# Altium schematic symbol library 13-Logicold 逻辑 IC.SchLib: 297 symbols (part 8 of 30)
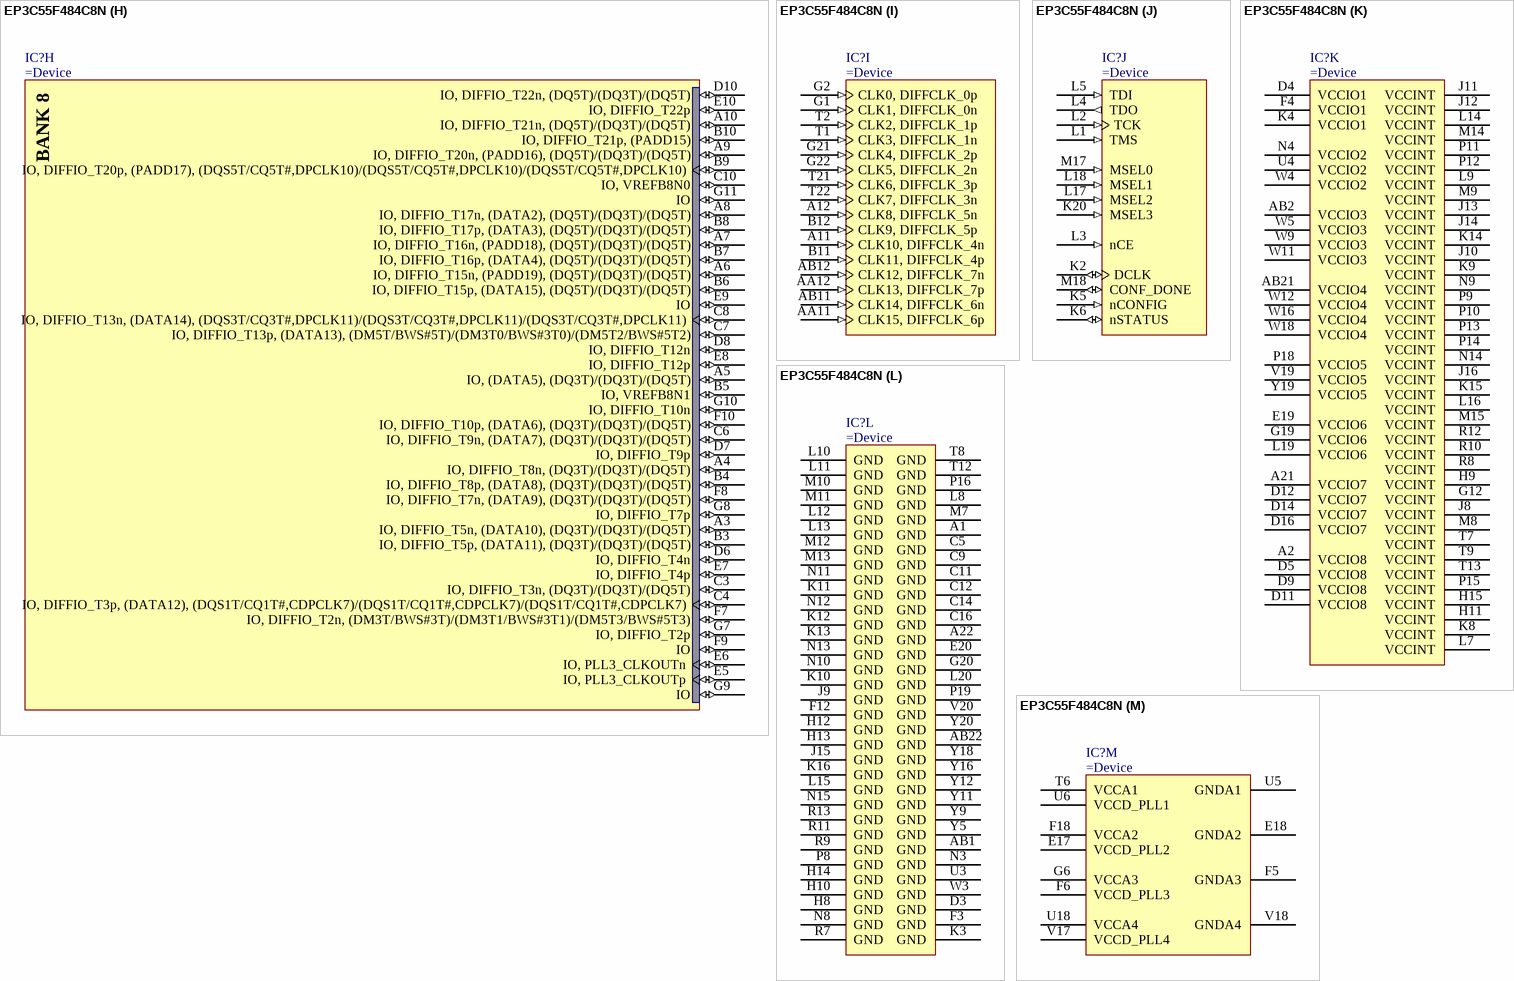
[diagram p169: symbol EP3C55F484C8N]

## EP3C55F484C8N
designator IC?
Cyclone III Family FPGA, 377 I/O Pins, 4 PLLs, 484-Pin FBGA, Speed Grade 8, Commercial Grade
part A pins: B1 IO, DIFFIO_L2n, (DQ2L)/(DQ1L)/(DQ1L) (io), B2 IO, DIFFIO_L2p, (DQ2L)/(DQ1L)/(DQ1L) (io), C1 IO, DIFFIO_L4n, (DQ2L)/(DQ1L)/(DQ1L) (io), C2 IO, DIFFIO_L4p, (DQS2L/CQ3L,CDPCLK0)/(DQS2L/CQ3L,CDPCLK0)/(DQS2L/CQ3L,CDPCLK0) (io), D1 IO, DIFFIO_L5n, (DATA1, ASDO) (io), D2 IO, DIFFIO_L5p, (DQ2L)/(DQ1L)/(DQ1L) (io), E1 IO, DIFFIO_L8n, _/(DQ1L)/(DQ1L) (io), E2 IO, DIFFIO_L8p, (FLASH_nCE, nCSO) (io), E3 IO, DIFFIO_L3n, (DQ2L)/(DQ1L)/(DQ1L) (io), E4 IO, DIFFIO_L3p, (nRESET), (DQ2L)/(DQ1L)/(DQ1L) (io), F1 IO, DIFFIO_L9n, (DQ0L)/(DQ1L)/(DQ1L) (io), F2 IO, DIFFIO_L9p, (DM2L)/(DM1L0/BWS#1L0)/(DM1L0/BWS#1L0) (io), G3 IO, DIFFIO_L1n (io), G4 IO, DIFFIO_L1p (io), G5 IO, VREFB1N0 (io), H1 IO, DIFFIO_L13n, (DQ0L)/(DQ1L)/(DQ1L) (io), H2 IO, DIFFIO_L13p, (DQ0L)/(DQ1L)/(DQ1L) (io), H3 IO, DIFFIO_L7n (io), H4 IO, DIFFIO_L7p (io), H5 IO, VREFB1N1 (io), H6 IO, DIFFIO_L6p, (DQ2L)/(DQ1L)/(DQ1L) (io), H7 IO (io), J1 IO, DIFFIO_L15n, (DQ0L)/(DQ1L)/(DQ1L) (io), J2 IO, DIFFIO_L15p, (DQ0L)/(DQ1L)/(DQ1L) (io), J3 IO (io), J4 IO, (DQS0L/CQ1L,DPCLK0)/(DQS0L/CQ1L,DPCLK0)/(DQS0L/CQ1L,DPCLK0) (io), J5 IO (io), J6 IO, DIFFIO_L6n, (DQ2L)/(DQ1L)/(DQ1L) (io), J7 IO, DIFFIO_L11p (io), K1 IO, (DATA0) (io), K7 IO, DIFFIO_L11n (io)
part B pins: AA1 IO, DIFFIO_L31n, (DQ3L)/(DQ3L)/(DQ1L) (io), AA2 IO, DIFFIO_L31p (io), L6 IO, DIFFIO_L16p, (DQ0L)/(DQ1L)/(DQ1L) (io), M1 IO, DIFFIO_L17n, _/(DQ1L)/(DQ1L) (io), M2 IO, DIFFIO_L17p, (DQ0L)/(DQ1L)/(DQ1L) (io), M3 IO, DIFFIO_L18n, (DQ1L)/(DQ3L)/(DQ1L) (io), M4 IO, DIFFIO_L18p, (DM0L)/(DM1L1/BWS#1L1)/(DM1L1/BWS#1L1) (io), M5 IO, VREFB2N0 (io), M6 IO, DIFFIO_L16n, (DQ0L)/(DQ1L)/(DQ1L) (io), N1 IO, DIFFIO_L19n, (DQ1L)/(DQ3L)/(DQ1L) (io), N2 IO, DIFFIO_L19p, (DQ1L)/(DQ3L)/(DQ1L) (io), N5 IO, (DQ1L)/(DQ3L)/(DQ1L) (io), N6 IO, DIFFIO_L26n, (DQ3L)/(DQ3L)/(DQ1L) (io), N7 IO, DIFFIO_L30p (io), P1 IO, DIFFIO_L20n, (DQ1L)/(DQ3L)/(DQ1L) (io), P2 IO, DIFFIO_L20p, (DQ1L)/(DQ3L)/(DQ1L) (io), P3 IO, DIFFIO_L23n, (DQ1L)/(DQ3L)/(DQ1L) (io), P4 IO, DIFFIO_L23p, (DQS1L/CQ1L#,DPCLK1)/(DQS1L/CQ1L#,DPCLK1)/(DQS1L/CQ1L#,DPCLK1) (io), P5 IO, DIFFIO_L26p (io), P6 IO, DIFFIO_L32p (io), P7 IO, DIFFIO_L30n (io), R1 IO, DIFFIO_L21n, (DQ1L)/(DQ3L)/(DQ1L) (io), R2 IO, DIFFIO_L21p, (DQ1L)/(DQ3L)/(DQ1L) (io), R3 IO, DIFFIO_L27n (io), R4 IO, DIFFIO_L27p (io), R5 IO, DIFFIO_L32n (io), R6 IO, DIFFIO_L33n (io), T3 IO, VREFB2N1 (io), T4 IO, (DQS3L/CQ3L#,CDPCLK1)/(DQS3L/CQ3L#,CDPCLK1)/(DQS3L/CQ3L#,CDPCLK1) (io), T5 IO, DIFFIO_L33p, (DM3L/BWS#3L)/(DM3L1/BWS#3L1)/(DM1L3/BWS#1L3) (io), U1 IO, DIFFIO_L24n, (DQ3L)/(DQ3L)/(DQ1L) (io), U2 IO, DIFFIO_L24p, (DM1L/BWS#1L)/(DM3L0/BWS#3L0)/(DM1L2/BWS#1L2) (io), V1 IO, DIFFIO_L25n, (DQ3L)/(DQ3L)/(DQ1L) (io), V2 IO, DIFFIO_L25p, (DQ3L)/(DQ3L)/(DQ1L) (io), V3 IO, RDN1 (io), V4 IO, RUP1 (io), W1 IO, DIFFIO_L28n, (DQ3L)/(DQ3L)/(DQ1L) (io), W2 IO, DIFFIO_L28p, (DQ3L)/(DQ3L)/(DQ1L) (io), Y1 IO, DIFFIO_L29n, (DQ3L)/(DQ3L)/(DQ1L) (io), Y2 IO, DIFFIO_L29p, (DQ3L)/(DQ3L)/(DQ1L) (io)
part C pins: AA3 IO, PLL1_CLKOUTp (io), AA4 IO, (DQ3B)/(DQ3B)/(DQ5B) (io), AA5 IO, DIFFIO_B5p, (DQ3B)/(DQ3B)/(DQ5B) (io), AA6 IO, DIFFIO_B5n (io), AA7 IO, DIFFIO_B10p, (DM5B/BWS#5B)/(DM3B0/BWS#3B0)/(DM5B2/BWS#5B2) (io), AA8 IO, DIFFIO_B17p, (DQ5B)/(DQ3B)/(DQ5B) (io), AA9 IO, DIFFIO_B18p, (DQ5B)/(DQ3B)/(DQ5B) (io), AA10 IO, DIFFIO_B21p, (DM4B)/(DM5B1/BWS#5B1)/(DM5B1/BWS#5B1) (io), AB3 IO, PLL1_CLKOUTn (io), AB4 IO, VREFB3N1 (io), AB5 IO, DIFFIO_B6n (io), AB6 IO, DIFFIO_B6p (io), AB7 IO, DIFFIO_B10n, (DQ5B)/(DQ3B)/(DQ5B) (io), AB8 IO, DIFFIO_B17n, (DQ5B)/(DQ3B)/(DQ5B) (io), AB9 IO, DIFFIO_B18n, (DQS5B/CQ5B#,DPCLK3)/(DQS5B/CQ5B#,DPCLK3)/(DQS5B/CQ5B#,DPCLK3) (io), AB10 IO, DIFFIO_B21n, _/(DQ5B)/(DQ5B) (io), T10 IO, DIFFIO_B13p (io), T11 IO, DIFFIO_B13n (io), U7 IO, DIFFIO_B2p (io), U8 IO, DIFFIO_B2n (io), U9 IO, DIFFIO_B8p, (DQ3B)/(DQ3B)/(DQ5B) (io), U10 IO, (DQ5B)/(DQ3B)/(DQ5B) (io), U11 IO, DIFFIO_B19p (io), V5 IO, DIFFIO_B1n, (DM3B/BWS#3B)/(DM3B1/BWS#3B1)/(DM5B3/BWS#5B3) (io), V6 IO, DIFFIO_B1p (io), V7 IO, DIFFIO_B4n (io), V8 IO, DIFFIO_B8n, (DQ3B)/(DQ3B)/(DQ5B) (io), V9 IO, VREFB3N0 (io), V10 IO, (DQS3B/CQ3B#,DPCLK2)/(DQS3B/CQ3B#,DPCLK2)/(DQS3B/CQ3B#,DPCLK2) (io), V11 IO, DIFFIO_B19n, (DQ5B)/(DQ3B)/(DQ5B) (io), W6 IO, DIFFIO_B4p, (DQ3B)/(DQ3B)/(DQ5B) (io), W7 IO, DIFFIO_B7p, (DQ3B)/(DQ3B)/(DQ5B) (io), W8 IO, (DQ3B)/(DQ3B)/(DQ5B) (io), W10 IO, DIFFIO_B20p, (DQ5B)/(DQ3B)/(DQ5B) (io), Y3 IO, DIFFIO_B3n, (DQ3B)/(DQ3B)/(DQ5B) (io), Y4 IO, DIFFIO_B3p (io), Y6 IO, (DQS1B/CQ1B#,CDPCLK2)/(DQS1B/CQ1B#,CDPCLK2)/(DQS1B/CQ1B#,CDPCLK2) (io), Y7 IO, DIFFIO_B7n, (DQ3B)/(DQ3B)/(DQ5B) (io), Y8 IO, (DQ5B)/(DQ3B)/(DQ5B) (io), Y10 IO, DIFFIO_B20n, (DQ5B)/(DQ3B)/(DQ5B) (io)
part D pins: AA13 IO, DIFFIO_B23p, (DQ4B)/(DQ5B)/(DQ5B) (io), AA14 IO, DIFFIO_B25p, (DQ4B)/(DQ5B)/(DQ5B) (io), AA15 IO, DIFFIO_B27p, (DQ4B)/(DQ5B)/(DQ5B) (io), AA16 IO, DIFFIO_B30p, (DM2B)/(DM5B0/BWS#5B0)/(DM5B0/BWS#5B0) (io), AA17 IO, DIFFIO_B37p (io), AA18 IO, VREFB4N0 (io), AA19 IO, RUP2 (io), AA20 IO, DIFFIO_B39p, _/(DQ5B)/(DQ5B) (io), AB13 IO, DIFFIO_B23n, (DQ4B)/(DQ5B)/(DQ5B) (io), AB14 IO, DIFFIO_B25n, (DQ4B)/(DQ5B)/(DQ5B) (io), AB15 IO, DIFFIO_B27n, (DQ4B)/(DQ5B)/(DQ5B) (io), AB16 IO, DIFFIO_B30n, (DQ2B)/(DQ5B)/(DQ5B) (io), AB17 IO, DIFFIO_B37n (io), AB18 IO, (DQ2B)/(DQ5B)/(DQ5B) (io), AB19 IO, RDN2 (io), AB20 IO, DIFFIO_B39n, (DQ2B)/(DQ5B)/(DQ5B) (io), R14 IO, DIFFIO_B41p (io), R15 IO, DIFFIO_B41n (io), R16 IO, PLL4_CLKOUTn (io), T14 IO, DIFFIO_B36p (io), T15 IO, DIFFIO_B36n, (DQ2B)/(DQ5B)/(DQ5B) (io), T16 IO, PLL4_CLKOUTp (io), U12 IO, (DQ4B)/(DQ5B)/(DQ5B) (io), U13 IO (io), U14 IO, DIFFIO_B33n (io), U15 IO, DIFFIO_B34p (io), U16 IO, DIFFIO_B40p (io), U17 IO, DIFFIO_B40n (io), V12 IO, VREFB4N1 (io), V13 IO, DIFFIO_B31p, (DQS2B/CQ3B,DPCLK5)/(DQS2B/CQ3B,DPCLK5)/(DQS2B/CQ3B,DPCLK5) (io), V14 IO, DIFFIO_B33p, (DQ2B)/(DQ5B)/(DQ5B) (io), V15 IO, DIFFIO_B34n, (DQ2B)/(DQ5B)/(DQ5B) (io), V16 IO (io), W13 IO, DIFFIO_B26p, (DQ4B)/(DQ5B)/(DQ5B) (io), W14 IO, DIFFIO_B31n (io), W15 IO, (DQ2B)/(DQ5B)/(DQ5B) (io), W17 IO, DIFFIO_B38p, (DQ2B)/(DQ5B)/(DQ5B) (io), Y13 IO, DIFFIO_B26n, (DQS4B/CQ5B,DPCLK4)/(DQS4B/CQ5B,DPCLK4)/(DQS4B/CQ5B,DPCLK4) (io), Y14 IO, DIFFIO_B29p (io), Y15 IO, DIFFIO_B29n (io), Y17 IO, DIFFIO_B38n, (DQS0B/CQ1B,CDPCLK3)/(DQS0B/CQ1B,CDPCLK3)/(DQS0B/CQ1B,CDPCLK3) (io)
part E pins: AA21 IO, DIFFIO_R36p, (DM3R/BWS#3R)/(DM3R1/BWS#3R1)/(DM1R3/BWS#1R3) (io), AA22 IO, DIFFIO_R36n (io), M16 IO (io), M19 IO, DIFFIO_R18p, (DQ1R)/(DQ3R)/(DQ1R) (io), M20 IO, DIFFIO_R18n, (DQ1R)/(DQ3R)/(DQ1R) (io), M21 IO, DIFFIO_R19p, (DQ1R)/(DQ3R)/(DQ1R) (io), M22 IO, DIFFIO_R19n, (DQ1R)/(DQ3R)/(DQ1R) (io), N16 IO (io), N17 IO, DIFFIO_R21n (io), N18 IO, DIFFIO_R21p, (DQS1R/CQ1R#,DPCLK6)/(DQS1R/CQ1R#,DPCLK6)/(DQS1R/CQ1R#,DPCLK6) (io), N19 IO, DIFFIO_R22p (io), N20 IO, DIFFIO_R22n, (DQ1R)/(DQ3R)/(DQ1R) (io), N21 IO, DIFFIO_R20p, (DEV_CLRn) (io), N22 IO, DIFFIO_R20n, (DEV_OE) (io), P17 IO, DIFFIO_R30p (io), P20 IO, VREFB5N0 (io), P21 IO, DIFFIO_R23p, (DQ1R)/(DQ3R)/(DQ1R) (io), P22 IO, DIFFIO_R23n, (DQ1R)/(DQ3R)/(DQ1R) (io), R17 IO, DIFFIO_R30n (io), R18 IO, DIFFIO_R26n (io), R19 IO, DIFFIO_R26p, (DM1R/BWS#1R)/(DM3R0/BWS#3R0)/(DM1R2/BWS#1R2) (io), R20 IO, (DQ3R)/(DQ3R)/(DQ1R) (io), R21 IO, DIFFIO_R24p, (DQ1R)/(DQ3R)/(DQ1R) (io), R22 IO, DIFFIO_R24n, (DQ1R)/(DQ3R)/(DQ1R) (io), T17 IO, RUP3 (io), T18 IO, RDN3 (io), T19 IO, DIFFIO_R31p (io), T20 IO, DIFFIO_R31n (io), U19 IO, DIFFIO_R34p (io), U20 IO, DIFFIO_R34n, (DQ3R)/(DQ3R)/(DQ1R) (io), U21 IO, DIFFIO_R27p, (DQ3R)/(DQ3R)/(DQ1R) (io), U22 IO, DIFFIO_R27n, (DQ3R)/(DQ3R)/(DQ1R) (io), V21 IO, DIFFIO_R29p, (DQ3R)/(DQ3R)/(DQ1R) (io), V22 IO, DIFFIO_R29n, (DQ3R)/(DQ3R)/(DQ1R) (io), W19 IO, VREFB5N1 (io), W20 IO, (DQS3R/CQ3R#,CDPCLK4)/(DQS3R/CQ3R#,CDPCLK4)/(DQS3R/CQ3R#,CDPCLK4) (io), W21 IO, DIFFIO_R32p, (DQ3R)/(DQ3R)/(DQ1R) (io), W22 IO, DIFFIO_R32n, (DQ3R)/(DQ3R)/(DQ1R) (io), Y21 IO, DIFFIO_R35p (io), Y22 IO, DIFFIO_R35n, (DQ3R)/(DQ3R)/(DQ1R) (io)
part F pins: B21 IO, DIFFIO_R3p, (PADD21), (DQ2R)/(DQ1R)/(DQ1R) (io), B22 IO, DIFFIO_R3n, (PADD22), (DQ2R)/(DQ1R)/(DQ1R) (io), C20 IO, DIFFIO_R2n, (PADD20), (DQS2R/CQ3R,CDPCLK5)/(DQS2R/CQ3R,CDPCLK5)/(DQS2R/CQ3R,CDPCLK5) (io), C21 IO, DIFFIO_R4p, (DQ2R)/(DQ1R)/(DQ1R) (io), C22 IO, DIFFIO_R4n, (DQ2R)/(DQ1R)/(DQ1R) (io), D20 IO, DIFFIO_R2p (io), D21 IO, DIFFIO_R7p, _/(DQ1R)/(DQ1R) (io), D22 IO, DIFFIO_R7n, (DM2R)/(DM1R0/BWS#1R0)/(DM1R0/BWS#1R0) (io), E21 IO, DIFFIO_R8p, (nOE), _/(DQ1R)/(DQ1R) (io), E22 IO, DIFFIO_R8n, (nWE), (DQ0R)/(DQ1R)/(DQ1R) (io), F17 IO, DIFFIO_R1n, (DQ2R)/(DQ1R)/(DQ1R) (io), F19 IO, DIFFIO_R6p, (RDY), (DQ2R)/(DQ1R)/(DQ1R) (io), F20 IO, DIFFIO_R6n, (nAVD), (DQ2R)/(DQ1R)/(DQ1R) (io), F21 IO, DIFFIO_R11p, (DQ0R)/(DQ1R)/(DQ1R) (io), F22 IO, DIFFIO_R11n, (DQ0R)/(DQ1R)/(DQ1R) (io), G17 IO, DIFFIO_R1p (io), G18 IO, DIFFIO_R5n, (PADD23), (DQ2R)/(DQ1R)/(DQ1R) (io), H16 IO (io), H17 IO, DIFFIO_R5p (io), H18 IO, VREFB6N0 (io), H19 IO, DIFFIO_R9p, (DQ0R)/(DQ1R)/(DQ1R) (io), H20 IO, DIFFIO_R9n, (DQ0R)/(DQ1R)/(DQ1R) (io), H21 IO, DIFFIO_R14p, (DQ0R)/(DQ1R)/(DQ1R) (io), H22 IO, DIFFIO_R14n, (DQ0R)/(DQ1R)/(DQ1R) (io), J17 IO (io), J18 IO (io), J19 IO, DIFFIO_R10p (io), J20 IO, DIFFIO_R10n (io), J21 IO, DIFFIO_R15p, (DM0R)/(DM1R1/BWS#1R1)/(DM1R1/BWS#1R1) (io), J22 IO, DIFFIO_R15n, (DQS0R/CQ1R,DPCLK7)/(DQS0R/CQ1R,DPCLK7)/(DQS0R/CQ1R,DPCLK7) (io), K17 IO, DIFFIO_R13n (io), K18 IO, DIFFIO_R13p, (DQ0R)/(DQ1R)/(DQ1R) (io), K19 IO, VREFB6N1 (io), K21 IO, DIFFIO_R16p, (CLKUSR) (io), K22 IO, DIFFIO_R16n, (nCEO) (io), L21 IO, DIFFIO_R17p, (CRC_ERROR) (io), L22 IO, DIFFIO_R17n, (INIT_DONE) (io)
part G pins: A13 IO, DIFFIO_T24n, (PADD11), (DQ4T)/(DQ5T)/(DQ5T) (io), A14 IO, DIFFIO_T25n, (PADD9), (DQ4T)/(DQ5T)/(DQ5T) (io), A15 IO, DIFFIO_T27n, (PADD5), (DQ4T)/(DQ5T)/(DQ5T) (io), A16 IO, DIFFIO_T30n, (DM2T)/(DM5T0/BWS#5T0)/(DM5T0/BWS#5T0) (io), A17 IO, DIFFIO_T31n, (PADD1), (DQ2T)/(DQ5T)/(DQ5T) (io), A18 IO, DIFFIO_T34n, (DQ2T)/(DQ5T)/(DQ5T) (io), A19 IO, RDN4 (io), A20 IO, PLL2_CLKOUTn (io), B13 IO, DIFFIO_T24p, (PADD12), (DQS4T/CQ5T,DPCLK9)/(DQS4T/CQ5T,DPCLK9)/(DQS4T/CQ5T,DPCLK9) (io), B14 IO, DIFFIO_T25p, (PADD10), (DQ4T)/(DQ5T)/(DQ5T) (io), B15 IO, DIFFIO_T27p, (PADD6), (DQ4T)/(DQ5T)/(DQ5T) (io), B16 IO, DIFFIO_T30p, (DQ4T)/(DQ5T)/(DQ5T) (io), B17 IO, DIFFIO_T31p, (PADD2), _/(DQ5T)/(DQ5T) (io), B18 IO, DIFFIO_T34p, (PADD0) (io), B19 IO, RUP4 (io), B20 IO, PLL2_CLKOUTp (io), C13 IO, DIFFIO_T26n, (PADD7) (io), C15 IO, VREFB7N1 (io), C17 IO, (DQ2T)/(DQ5T)/(DQ5T) (io), C18 IO, DIFFIO_T39n (io), C19 IO, DIFFIO_T37n, (DQ2T)/(DQ5T)/(DQ5T) (io), D13 IO, DIFFIO_T26p, (PADD8), (DQ4T)/(DQ5T)/(DQ5T) (io), D15 IO, DIFFIO_T33n (io), D17 IO, VREFB7N0 (io), D18 IO, DIFFIO_T39p (io), D19 IO, DIFFIO_T37p, (DQ2T)/(DQ5T)/(DQ5T) (io), E11 IO, DIFFIO_T23n, (PADD13) (io), E12 IO, _/(DQ5T)/(DQ5T) (io), E13 IO (io), E14 IO, DIFFIO_T28n, (PADD3), (DQ4T)/(DQ5T)/(DQ5T) (io), E15 IO, DIFFIO_T33p, (DQ2T)/(DQ5T)/(DQ5T) (io), E16 IO, DIFFIO_T42p, (DQ2T)/(DQ5T)/(DQ5T) (io), F11 IO, DIFFIO_T23p, (PADD14), (DM4T)/(DM5T1/BWS#5T1)/(DM5T1/BWS#5T1) (io), F13 IO, DIFFIO_T28p, (PADD4), (DQS2T/CQ3T,DPCLK8)/(DQS2T/CQ3T,DPCLK8)/(DQS2T/CQ3T,DPCLK8) (io), F14 IO, DIFFIO_T40p, (DQS0T/CQ1T,CDPCLK6)/(DQS0T/CQ1T,CDPCLK6)/(DQS0T/CQ1T,CDPCLK6) (io), F15 IO, DIFFIO_T41n, (DQ2T)/(DQ5T)/(DQ5T) (io), F16 IO, DIFFIO_T42n (io), G13 IO, DIFFIO_T32p (io), G14 IO, DIFFIO_T32n (io), G15 IO, DIFFIO_T40n (io), G16 IO, DIFFIO_T41p (io)
part H pins: A3 IO, DIFFIO_T5n, (DATA10), (DQ3T)/(DQ3T)/(DQ5T) (io), A4 IO, DIFFIO_T8n, (DQ3T)/(DQ3T)/(DQ5T) (io), A5 IO, (DATA5), (DQ3T)/(DQ3T)/(DQ5T) (io), A6 IO, DIFFIO_T15n, (PADD19), (DQ5T)/(DQ3T)/(DQ5T) (io), A7 IO, DIFFIO_T16n, (PADD18), (DQ5T)/(DQ3T)/(DQ5T) (io), A8 IO, DIFFIO_T17n, (DATA2), (DQ5T)/(DQ3T)/(DQ5T) (io), A9 IO, DIFFIO_T20n, (PADD16), (DQ5T)/(DQ3T)/(DQ5T) (io), A10 IO, DIFFIO_T21n, (DQ5T)/(DQ3T)/(DQ5T) (io), B3 IO, DIFFIO_T5p, (DATA11), (DQ3T)/(DQ3T)/(DQ5T) (io), B4 IO, DIFFIO_T8p, (DATA8), (DQ3T)/(DQ3T)/(DQ5T) (io), B5 IO, VREFB8N1 (io), B6 IO, DIFFIO_T15p, (DATA15), (DQ5T)/(DQ3T)/(DQ5T) (io), B7 IO, DIFFIO_T16p, (DATA4), (DQ5T)/(DQ3T)/(DQ5T) (io), B8 IO, DIFFIO_T17p, (DATA3), (DQ5T)/(DQ3T)/(DQ5T) (io), B9 IO, DIFFIO_T20p, (PADD17), (DQS5T/CQ5T#,DPCLK10)/(DQS5T/CQ5T#,DPCLK10)/(DQS5T/CQ5T#,DPCLK10) (io), B10 IO, DIFFIO_T21p, (PADD15) (io), C3 IO, DIFFIO_T3n, (DQ3T)/(DQ3T)/(DQ5T) (io), C4 IO, DIFFIO_T3p, (DATA12), (DQS1T/CQ1T#,CDPCLK7)/(DQS1T/CQ1T#,CDPCLK7)/(DQS1T/CQ1T#,CDPCLK7) (io), C6 IO, DIFFIO_T9n, (DATA7), (DQ3T)/(DQ3T)/(DQ5T) (io), C7 IO, DIFFIO_T13p, (DATA13), (DM5T/BWS#5T)/(DM3T0/BWS#3T0)/(DM5T2/BWS#5T2) (io), C8 IO, DIFFIO_T13n, (DATA14), (DQS3T/CQ3T#,DPCLK11)/(DQS3T/CQ3T#,DPCLK11)/(DQS3T/CQ3T#,DPCLK11) (io), C10 IO, VREFB8N0 (io), D6 IO, DIFFIO_T4n (io), D7 IO, DIFFIO_T9p (io), D8 IO, DIFFIO_T12n (io), D10 IO, DIFFIO_T22n, (DQ5T)/(DQ3T)/(DQ5T) (io), E5 IO, PLL3_CLKOUTp (io), E6 IO, PLL3_CLKOUTn (io), E7 IO, DIFFIO_T4p (io), E8 IO, DIFFIO_T12p (io), E9 IO (io), E10 IO, DIFFIO_T22p (io), F7 IO, DIFFIO_T2n, (DM3T/BWS#3T)/(DM3T1/BWS#3T1)/(DM5T3/BWS#5T3) (io), F8 IO, DIFFIO_T7n, (DATA9), (DQ3T)/(DQ3T)/(DQ5T) (io), F9 IO (io), F10 IO, DIFFIO_T10p, (DATA6), (DQ3T)/(DQ3T)/(DQ5T) (io), G7 IO, DIFFIO_T2p (io), G8 IO, DIFFIO_T7p (io), G9 IO (io), G10 IO, DIFFIO_T10n (io), G11 IO (io)
part I pins: A11 CLK10, DIFFCLK_4n (in), A12 CLK8, DIFFCLK_5n (in), AA11 CLK15, DIFFCLK_6p (in), AA12 CLK13, DIFFCLK_7p (in), AB11 CLK14, DIFFCLK_6n (in), AB12 CLK12, DIFFCLK_7n (in), B11 CLK11, DIFFCLK_4p (in), B12 CLK9, DIFFCLK_5p (in), G1 CLK1, DIFFCLK_0n (in), G2 CLK0, DIFFCLK_0p (in), G21 CLK4, DIFFCLK_2p (in), G22 CLK5, DIFFCLK_2n (in), T1 CLK3, DIFFCLK_1n (in), T2 CLK2, DIFFCLK_1p (in), T21 CLK6, DIFFCLK_3p (in), T22 CLK7, DIFFCLK_3n (in)
part J pins: K2 DCLK (io), K5 nCONFIG (in), K6 nSTATUS (io), K20 MSEL3 (in), L1 TMS (in), L2 TCK (in), L3 nCE (in), L4 TDO (out), L5 TDI (in), L17 MSEL2 (in), L18 MSEL1 (in), M17 MSEL0 (in), M18 CONF_DONE (io)
part K pins: A2 VCCIO8 (power), A21 VCCIO7 (power), AB2 VCCIO3 (power), AB21 VCCIO4 (power), D4 VCCIO1 (power), D5 VCCIO8 (power), D9 VCCIO8 (power), D11 VCCIO8 (power), D12 VCCIO7 (power), D14 VCCIO7 (power), D16 VCCIO7 (power), E19 VCCIO6 (power), F4 VCCIO1 (power), G12 VCCINT (power), G19 VCCIO6 (power), H9 VCCINT (power), H11 VCCINT (power), H15 VCCINT (power), J8 VCCINT (power), J10 VCCINT (power), J11 VCCINT (power), J12 VCCINT (power), J13 VCCINT (power), J14 VCCINT (power), J16 VCCINT (power), K4 VCCIO1 (power), K8 VCCINT (power), K9 VCCINT (power), K14 VCCINT (power), K15 VCCINT (power), L7 VCCINT (power), L9 VCCINT (power), L14 VCCINT (power), L16 VCCINT (power), L19 VCCIO6 (power), M8 VCCINT (power), M9 VCCINT (power), M14 VCCINT (power), M15 VCCINT (power), N4 VCCIO2 (power), N9 VCCINT (power), N14 VCCINT (power), P9 VCCINT (power), P10 VCCINT (power), P11 VCCINT (power), P12 VCCINT (power), P13 VCCINT (power), P14 VCCINT (power), P15 VCCINT (power), P18 VCCIO5 (power), R8 VCCINT (power), R10 VCCINT (power), R12 VCCINT (power), T7 VCCINT (power), T9 VCCINT (power), T13 VCCINT (power), U4 VCCIO2 (power), V19 VCCIO5 (power), W4 VCCIO2 (power), W5 VCCIO3 (power), W9 VCCIO3 (power), W11 VCCIO3 (power), W12 VCCIO4 (power), W16 VCCIO4 (power), W18 VCCIO4 (power), Y19 VCCIO5 (power)
part L pins: A1 GND (power), A22 GND (power), AB1 GND (power), AB22 GND (power), C5 GND (power), C9 GND (power), C11 GND (power), C12 GND (power), C14 GND (power), C16 GND (power), D3 GND (power), E20 GND (power), F3 GND (power), F12 GND (power), G20 GND (power), H8 GND (power), H10 GND (power), H12 GND (power), H13 GND (power), H14 GND (power), J9 GND (power), J15 GND (power), K3 GND (power), K10 GND (power), K11 GND (power), K12 GND (power), K13 GND (power), K16 GND (power), L8 GND (power), L10 GND (power), L11 GND (power), L12 GND (power), L13 GND (power), L15 GND (power), L20 GND (power), M7 GND (power), M10 GND (power), M11 GND (power), M12 GND (power), M13 GND (power), N3 GND (power), N8 GND (power), N10 GND (power), N11 GND (power), N12 GND (power), N13 GND (power), N15 GND (power), P8 GND (power), P16 GND (power), P19 GND (power), R7 GND (power), R9 GND (power), R11 GND (power), R13 GND (power), T8 GND (power), T12 GND (power), U3 GND (power), V20 GND (power), W3 GND (power), Y5 GND (power), Y9 GND (power), Y11 GND (power), Y12 GND (power), Y16 GND (power), Y18 GND (power), Y20 GND (power)
part M pins: E17 VCCD_PLL2 (power), E18 GNDA2 (power), F5 GNDA3 (power), F6 VCCD_PLL3 (power), F18 VCCA2 (power), G6 VCCA3 (power), T6 VCCA1 (power), U5 GNDA1 (power), U6 VCCD_PLL1 (power), U18 VCCA4 (power), V17 VCCD_PLL4 (power), V18 GNDA4 (power)

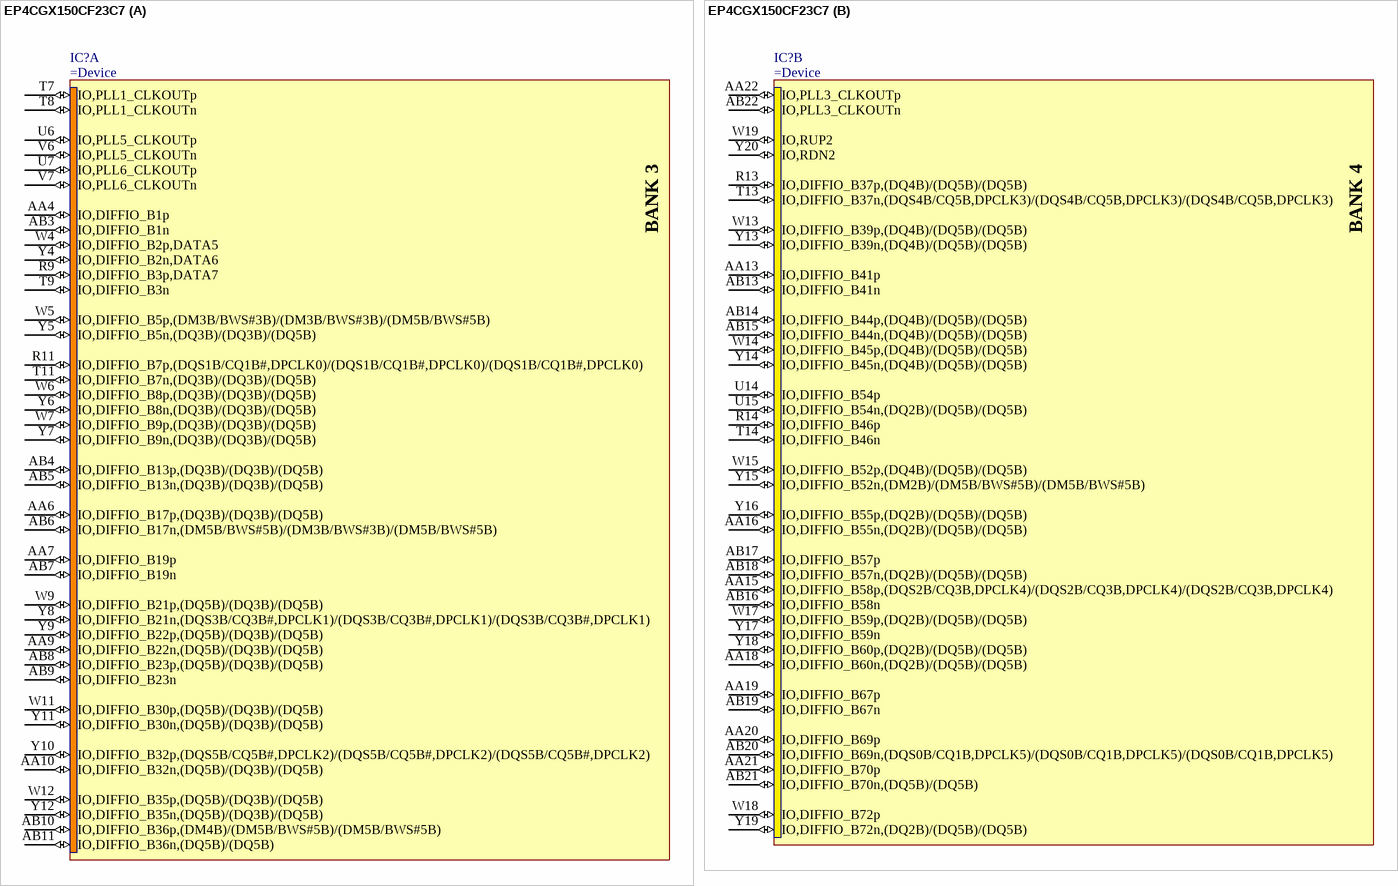
[diagram p45: symbol EP4CGX150CF23C7]

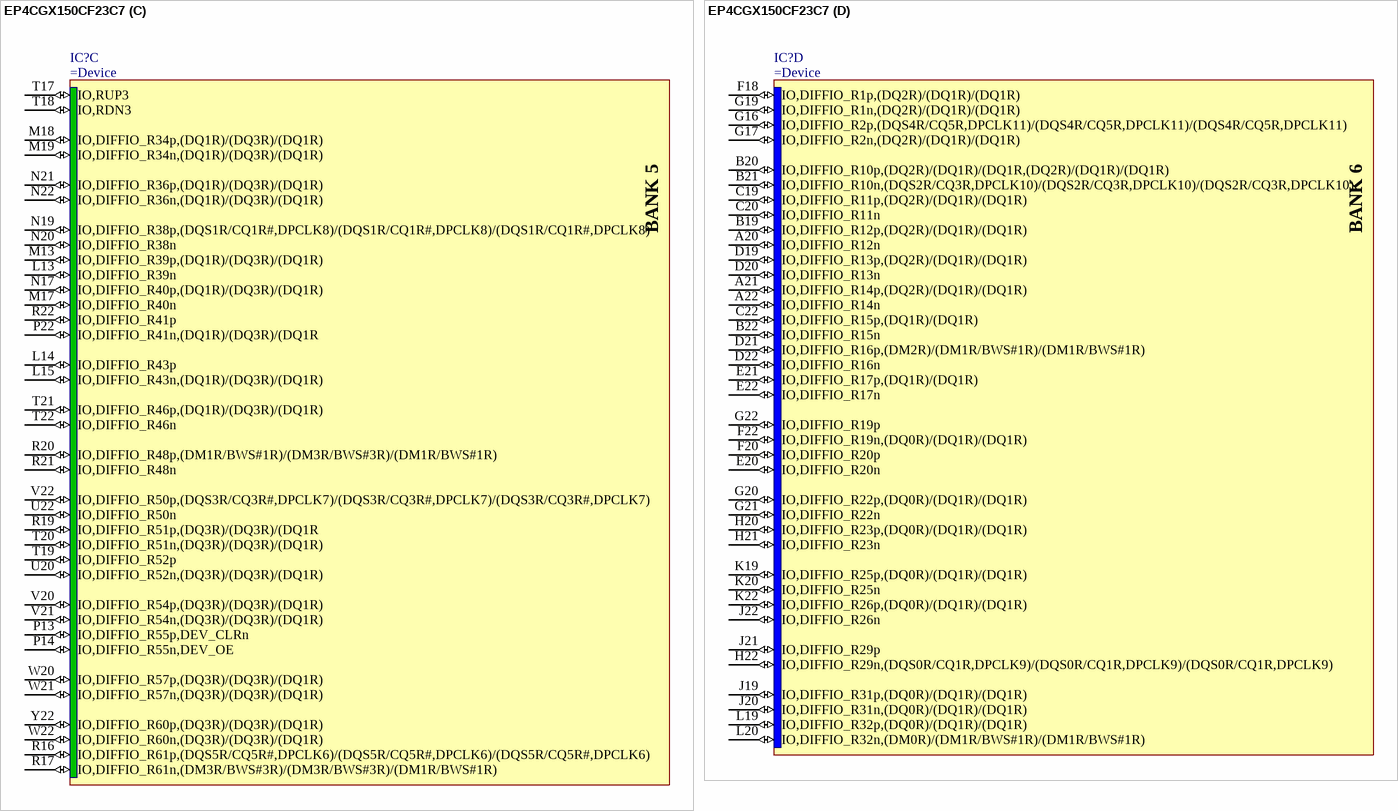
[diagram p46: symbol EP4CGX150CF23C7]

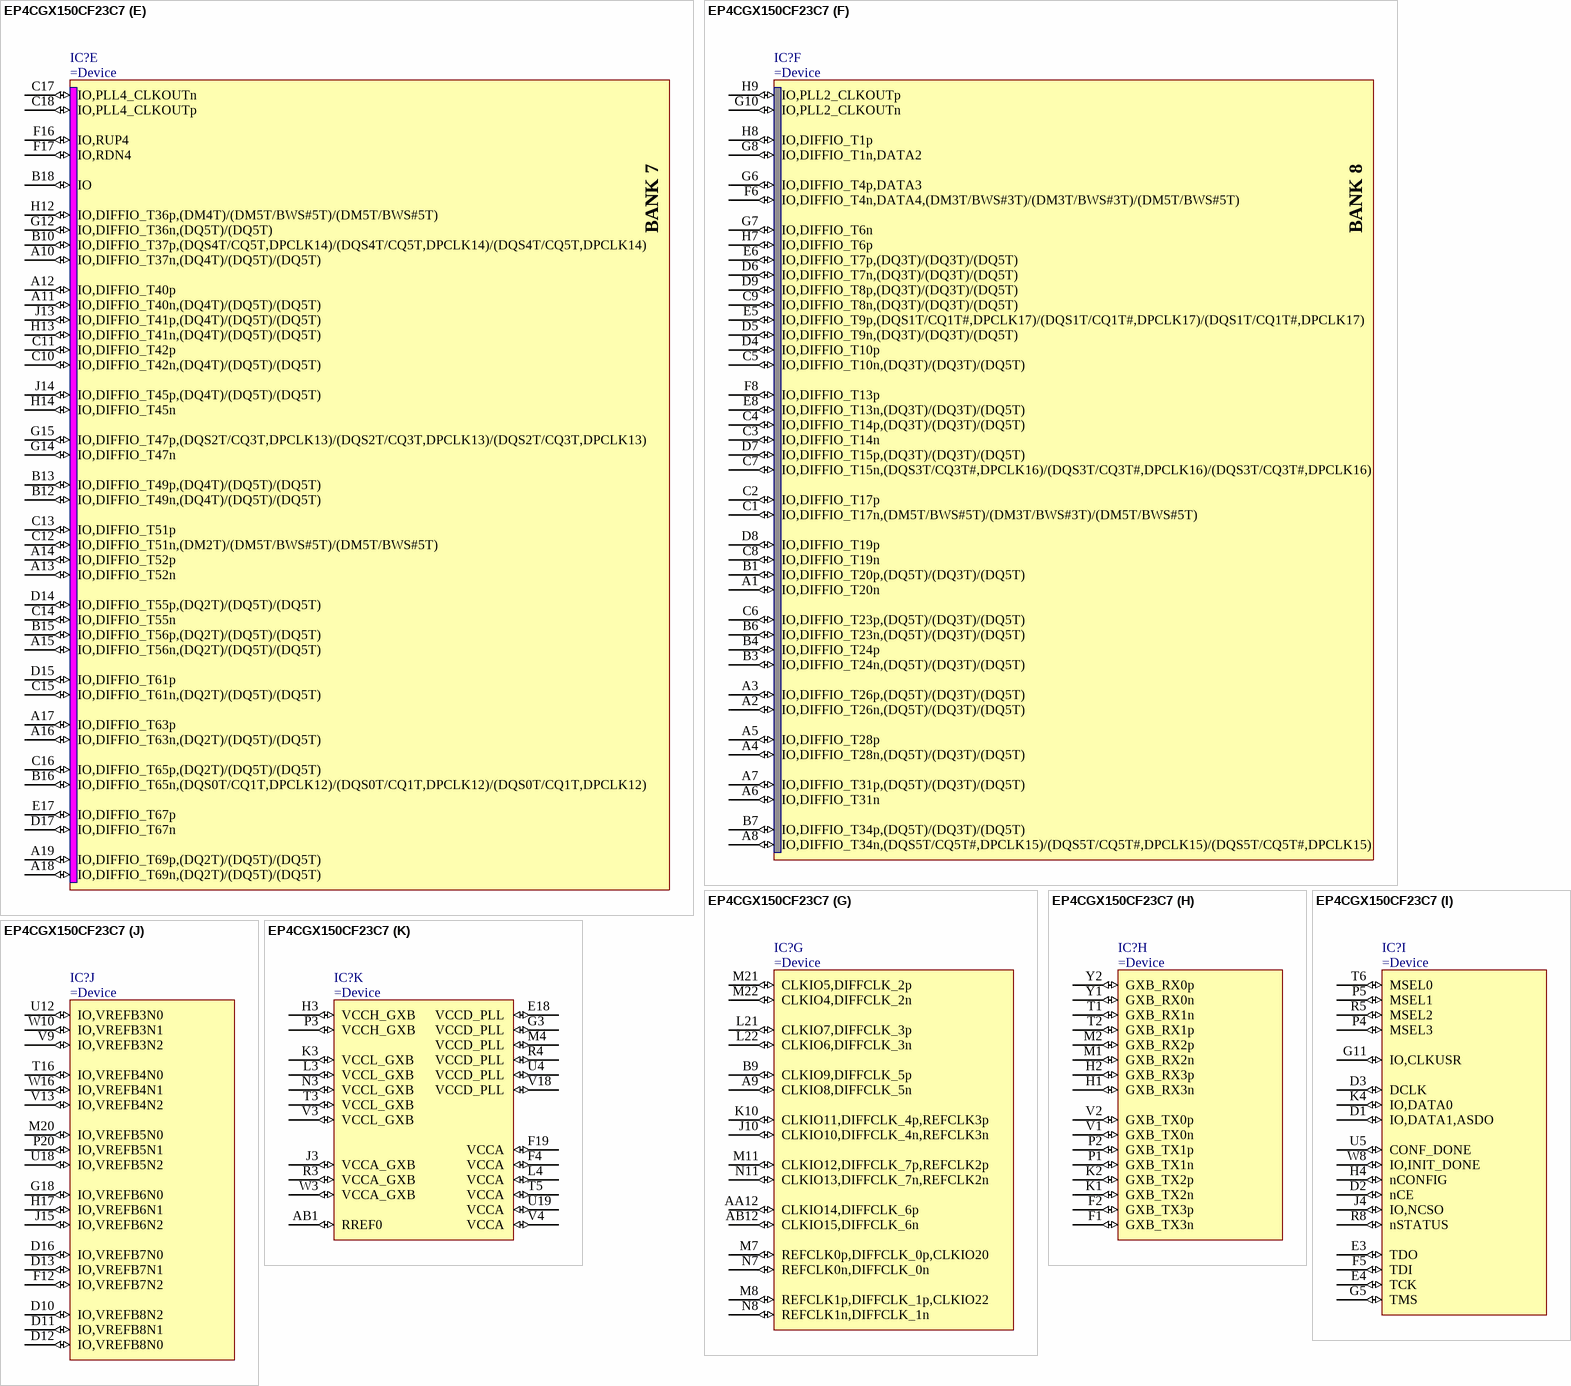
[diagram p47: symbol EP4CGX150CF23C7]
